# Altium footprint library AUAV_X05.PcbLib: 69 footprints (part 1 of 5)
Each footprint in its own frame and in the unit in brackets; x right, y up, seen from the top. Pads: shape width x height; smd on the part's side, far side on the other; paste and mask are expansions set on the pad; w line width, h text height; cw(c..) or ccw(c..) is an arc to the next point about the centre after c.
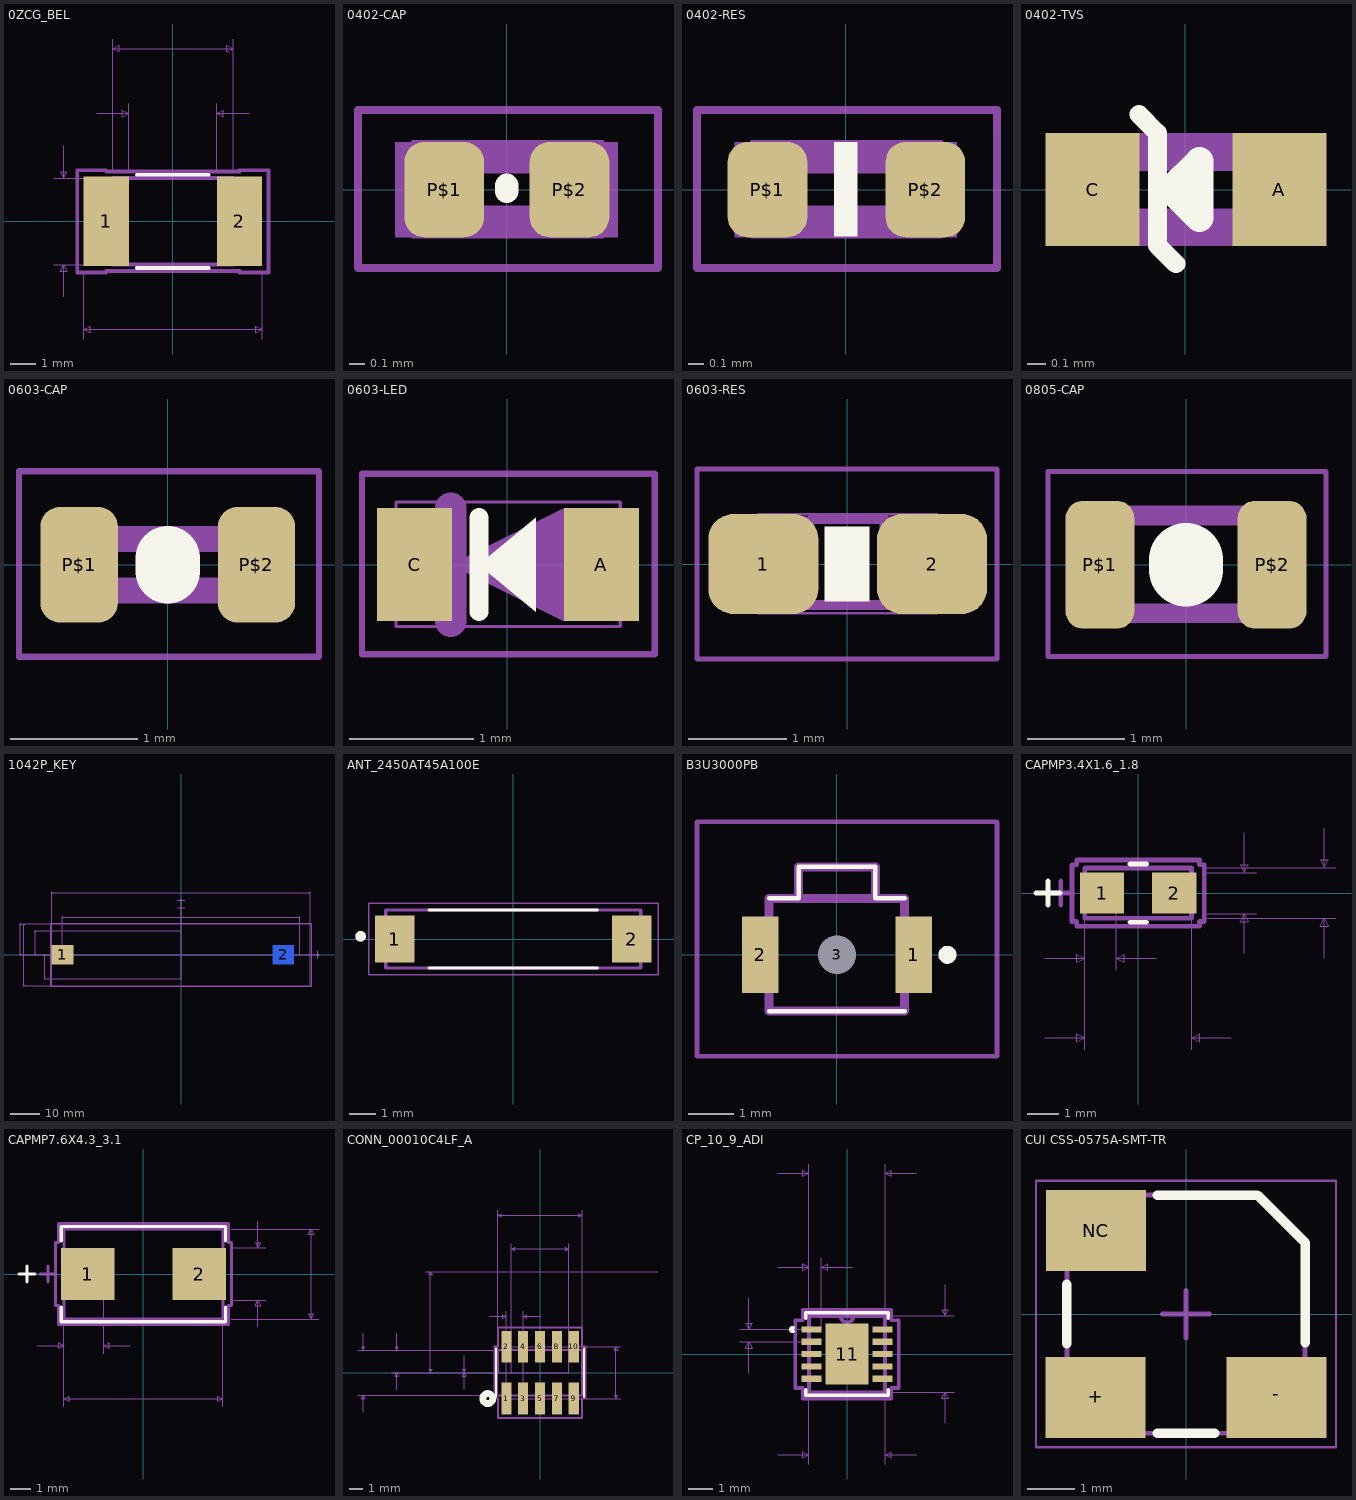
[diagram p0: the footprints below, top view; thin cyan lines are the x and y axes]

## 0ZCG_BEL [mil]
pads (2):
  rect 70x138 smd: 1(-103,0) 2(103,0)
Top Overlay:
  lines w6: -55.25,-72 55.25,-72 ; -55.25,72 55.25,72
Mechanical 1:
  lines w1: -93,-67 -93,67 93,67 93,-67 -93,-67
Mechanical 16:
  lines w1: -184,-67 103,-67 ; -184,67 103,67 ; -169,-117 -169,-67 ; -169,117 -169,67 ; -138,-182 -138,-79 ; -118,167 -68,167 ; -93,79 -93,282 ; -68,79 -68,182 ; 68,79 68,182 ; 93,79 93,282 ; 118,167 68,167 ; 138,-182 138,-79 ; -169,-67 -164,-77 -174,-77 -169,-67 ; -169,67 -164,77 -174,77 -169,67 ; -138,-167 -128,-172 -128,-162 -138,-167 ; -138,-167 138,-167 ; -93,267 -83,262 -83,272 -93,267 ; -93,267 93,267 ; -68,167 -78,162 -78,172 -68,167 ; 68,167 78,162 78,172 68,167 ; 93,267 83,262 83,272 93,267 ; 138,-167 128,-172 128,-162 138,-167
  lines w6: -148,-79 -103,-79 -103,-77 103,-77 103,-79 148,-79 148,79 103,79 103,77 -103,77 -103,79 -148,79 -148,-79 ; -93,-67 -93,67 93,67 93,-67 -93,-67
  text "0.134in/3.404mm" at -189,0 h15.62
  text "0.186in/4.724mm" at 0,287 h15.62
  text "0.136in/3.454mm" at 0,187 h15.62
  text "0.276in/7.01mm" at 0,-187 h15.62
  text "Alternate 2 Pad Style: OX90Y60D30P" at 0,-429 h31.25
  text "Alternate 1 Pad Style: OX60Y90D30P" at 0,-329 h31.25
  text "Default Pad Style: RX70Y138D0T" at 0,-229 h31.25
3D body "0ZCG_BEL.step": height 61.1, standoff -0.12, extent -92,-67.08 93.98,67.09

## 0402-CAP [mil]
pads (2):
  rrect50% 20x24 smd mask+0: P$1(-15.75,0) P$2(15.75,0)
Top Overlay:
  lines w6: 0,-0.39 0,1
Mechanical 16:
  rectangle: 15.96,-12 27.96,12
  rectangle: -28.04,-12 -16.04,12
  lines w1: -23.62,-11.81 -23.62,12 24,12 24,-11.81 -23.62,-11.81
  lines w2: -37.4,-19.68 -37.4,20 38,20 38,-19.68 -37.4,-19.68
  lines w8: -20,-8 20,-8 ; -20,8 20,8
3D body "cap_0402.STEP": height 19.68, standoff 0, extent -19.69,-9.84 19.69,9.84

## 0402-RES [mil] "0402-RES"
height 66.93
pads (2):
  rrect50% 20x24 smd: P$1(-19.68,0) P$2(20,0)
Top Overlay:
  rectangle: -3,-11.8 3,12.01
Mechanical 16:
  rectangle: -28,-12 -16,12
  rectangle: 16,-12 28,12
  lines w1: -23.62,-11.81 24,-11.81 24,12 -23.62,12 -23.62,-11.81
  lines w2: -37.4,-19.68 38,-19.68 38,20 -37.4,20 -37.4,-19.68
  lines w8: -20,-8 20,-8 ; -20,8 20,8
3D body "res_0402.STEP": height 19.68, standoff 0, extent -19.69,-9.84 19.69,9.84

## 0402-TVS [mil] "0402-TVS"
pads (2):
  rect 20x24 smd: A(20,0) C(-19.68,0)
Top Overlay:
  lines w4: -9.84,16 -5.91,12 -5.91,-11.81 -1.97,-15.75
  lines w6: -3,0 3,0 ; -3,0 3,-6 3,0 ; -3,0 3,6 3,0
Mechanical 16:
  rectangle: 16,-12 28,12
  rectangle: -28,-12 -16,12
  lines w8: -20,-8 20,-8 ; -20,8 20,8
3D body "res_0402.STEP": height 19.68, standoff 0, extent -19.69,-9.84 19.68,9.84

## 0603-CAP [mil] "0603-CAP"
pads (2):
  rrect50% 24x36 smd mask+0: P$1(-27.56,0) P$2(27.56,0)
Top Overlay:
  lines w20: 0,-2 0,2
Mechanical 16:
  rectangle: -28,-12 -16,12
  rectangle: 16,-12 28,12
  lines w2: -46.26,-28.54 47,-28.54 47,29 -46.26,29 -46.26,-28.54
  lines w8: -20,-8 20,-8 ; -20,8 20,8
3D body "cap_0603.STEP": height 34.25, standoff -0.39, extent -31.5,-15.95 31.5,15.94

## 0603-LED [mil] "0603-LED"
pads (2):
  rect 24x36 smd: A(30,0) C(-29.53,0)
Top Overlay:
  region: -9,0 9,15 9,-15
  lines w6: -9,-15 -9,15
Mechanical 16:
  region: -18,0 18,18 18,-18
  lines w1: -35.43,-19.68 36,-19.68 36,20 -35.43,20 -35.43,-19.68
  lines w2: -46.26,-28.54 47,-28.54 47,29 -46.26,29 -46.26,-28.54
  lines w10: -18,-18 -18,18
3D body "0603-LED-Blue.STEP": height 35.43, standoff 0, extent -33.46,-17.72 33.47,17.72

## 0603-RES [mil] "0603-RES"
pads (2):
  rrect50% 44x40 smd: 1(-33.46,0) 2(34,0)
Top Overlay:
  rectangle: -9,-15 9,15
Mechanical 6:
  rectangle: -7.87,-11.81 8,12
Mechanical 16:
  rectangle: -33,-18.5 -13.31,19
  rectangle: 13,-18.5 33,19
  lines w1: -35.43,-19.68 36,-19.68 36,20 -35.43,20 -35.43,-19.68
  lines w2: -60,-38 60,-38 60,38 -60,38 -60,-38
  lines w4: -14.02,-16.5 15,-16.5 ; -14.02,18 15,18
3D body "cap_0603.STEP": height 34.25, standoff -0.39, extent -31.5,-15.94 31.5,15.95

## 0805-CAP [mil]
pads (2):
  rrect50% 28x52 smd mask+0: P$1(-35,0) P$2(35,0)
Top Overlay:
  lines w30: 0,-2 0,2
Mechanical 16:
  rectangle: -39.37,-23.67 -23.62,24
  rectangle: 24,-23.67 40,24
  lines w2: -56.1,-37.4 57,-37.4 57,38 -56.1,38 -56.1,-37.4
  lines w8: -23.62,-19.68 24,-19.68 ; -23.62,20 24,20
3D body "cap_0805.STEP": height 30.79, standoff 0, extent -39.37,-24.6 39.37,24.6

## 1042P_KEY [mil]
pads (2):
  rect 294x255 smd: 1(-1562.5,0)
  rect 274.33x255 smd far side: 2(1345.98,0)
Mechanical 1:
  circle w20: c-1562.5,75 r15
  lines w1: -1702,-406.5 1702,-406.5 1702,-203.25 1702,203.25 1702,406.5 -1702,406.5 -1702,-406.5
Mechanical 16:
  lines w1: -2134.5,0 0,0 ; -2134.5,406.5 -1702,406.5 ; -2084.5,-406.5 -1702,-406.5 ; -2084.5,406.5 -1702,406.5 ; -1934.5,0 0,0 ; -1934.5,315 0,315 ; -1809.5,-315 0,-315 ; -1809.5,0 0,0 ; -1702,831.5 -1702,406.5 ; -1562.5,506.5 -1562.5,0 ; -50,616.5 0,616.5 ; -50,716.5 0,716.5 ; 50,616.5 0,616.5 ; 50,716.5 0,716.5 ; 1562.5,0 1562.5,506.5 ; 1702,406.5 1702,831.5 ; 1802,-50 1802,0 ; 1802,50 1802,0 ; -2119.5,0 -2119.5,406.5 ; -2119.5,0 -2124.5,10 -2114.5,10 -2119.5,0 ; -2119.5,406.5 -2124.5,396.5 -2114.5,396.5 -2119.5,406.5 ; -2069.5,-406.5 -2069.5,406.5 ; -2069.5,-406.5 -2074.5,-396.5 -2064.5,-396.5 -2069.5,-406.5 ; -2069.5,406.5 -2074.5,396.5 -2064.5,396.5 -2069.5,406.5 ; -1919.5,0 -1919.5,315 ; -1919.5,0 -1924.5,10 -1914.5,10 -1919.5,0 ; -1919.5,315 -1924.5,305 -1914.5,305 -1919.5,315 ; -1794.5,-315 -1794.5,0 ; -1794.5,-315 -1799.5,-305 -1789.5,-305 -1794.5,-315 ; -1794.5,0 -1799.5,-10 -1789.5,-10 -1794.5,0 ; -1702,816.5 1702,816.5 ; -1702,816.5 -1692,821.5 -1692,811.5 -1702,816.5 ; -1562.5,0 1817,0 -1562.5,0 ; -1562.5,491.5 1562.5,491.5 ; -1562.5,491.5 -1552.5,496.5 -1552.5,486.5 -1562.5,491.5 ; 0,-315 0,731.5 0,-315 ; 0,315 0,631.5 0,315 ; 0,616.5 -10,621.5 -10,611.5 0,616.5 ; 0,616.5 10,621.5 10,611.5 0,616.5 ; 0,716.5 -10,721.5 -10,711.5 0,716.5 ; 0,716.5 10,721.5 10,711.5 0,716.5 ; 1562.5,491.5 1552.5,496.5 1552.5,486.5 1562.5,491.5 ; 1702,816.5 1692,821.5 1692,811.5 1702,816.5 ; 1802,0 1797,10 1807,10 1802,0 ; 1802,0 1797,-10 1807,-10 1802,0
  lines w6: -1719.5,-416.5 -1719.5,416.5 1719.5,416.5 1719.5,-416.5 -1719.5,-416.5
  text "Default Padstyle: RX294Y255D0T" at 0,-516.5 h31.25
  text "1st Mtg Padstyle: EX136Y136D136P" at 0,-591.5 h31.25
  text "2nd Mtg Padstyle: EX136Y136D136P" at 0,-666.5 h31.25
  text "3rd Mtg Padstyle: EX94Y94D94P" at 0,-741.5 h31.25
  text "Left Mtg Padstyle: RX50Y100D30P" at 0,-816.5 h31.25
  text "Right Mtg Padstyle: RX50Y100D30P" at 0,-891.5 h31.25
  text "Alt Padstyle 1: OX60Y90D30P" at 0,-966.5 h31.25
  text "Alt Padstyle 2: OX90Y60D30P" at 0,-1041.5 h31.25
  text "3.125in/79.375mm" at -2343.75,511.5 h15.62
  text "0in/0mm" at 0,636.5 h15.62
  text "0in/0mm" at 0,736.5 h15.62
  text "3.404in/86.462mm" at 0,836.5 h15.62
  text "0in/0mm" at 1822,0 h15.62
  text "-0.315in/-8.001mm" at -1814.5,-157.5 h15.62
  text "0.315in/8.001mm" at -1939.5,157.5 h15.62
  text "0.406in/10.325mm" at -2139.5,203.25 h15.62
  text "0.813in/20.65mm" at -2089.5,0 h15.62
3D body "Battery.step": height 726.93, standoff 0, extent -1700.52,-406.5 1510.35,406.5

## ANT_2450AT45A100E [mm]
pads (2):
  rect 1.5x1.8 smd: 1(-4.5,0) 2(4.5,0)
Top Overlay:
  circle w0.2: c-5.8,0.1 r0.1
  lines w0.127: -3.2,-1.1 3.2,-1.1 ; -3.2,1.1 3.2,1.1
Top 3D Body:
  circle w0.2: c-5.8,0.1 r0.1
  lines w0.127: -4.85,-1.1 4.85,-1.1 4.85,1.1 -4.85,1.1 -4.85,-1.1
Mechanical 15:
  lines w0.05: -5.5,-1.35 -5.5,1.35 5.5,1.35 5.5,-1.35 -5.5,-1.35
3D body "2450AT45A100E--3DModel-STEP-56544.STEP": height 1.3, standoff 0, extent -4.75,-1 4.75,1

## B3U3000PB [mm]
pads (3):
  rect 0.8x1.7 smd: 1(1.7,0) 2(-1.7,0)
  round 0.425 hole 0.85 unplated: 3(0,0)
Top Overlay:
  lines w0.1: -1.5,-1.25 1.5,-1.25 ; -1.5,1.25 -0.85,1.25 -0.85,1.95 0.85,1.95 0.85,1.25 1.5,1.25
  lines w0.2: 2.345,0 ccw(c2.445,0) 2.545,0 ccw(c2.445,0) 2.345,0
Top 3D Body:
  lines w0.2: -0.85,1.25 -0.85,1.95 0.85,1.95 0.85,1.25 ; -1.5,-1.25 1.5,-1.25 1.5,1.25 -1.5,1.25 -1.5,-1.25
Mechanical 15:
  lines w0.1: -3.1,-2.25 3.545,-2.25 3.545,2.95 -3.1,2.95 -3.1,-2.25
3D body "B3U-3000P--3DModel-STEP-56544.STEP": height 1.2, standoff 0, extent -2,-1.25 2,1.95

## CAPMP3.4X1.6_1.8 [mm]
pads (2):
  rect 1.405x1.3 smd: 1(-1.15,0) 2(1.15,0)
Top Overlay:
  lines w0.152: -3.251,0 -2.489,0 ; -2.87,-0.381 -2.87,0.381 ; -0.263,-0.927 0.263,-0.927 ; -0.263,0.927 0.263,0.927
Mechanical 1:
  lines w0.025: -3.251,0 -2.489,0 ; -2.87,-0.381 -2.87,0.381 ; -1.7,-0.8 1.7,-0.8 1.7,0.8 -1.7,0.8 -1.7,-0.8
Mechanical 16:
  lines w0.025: -2.97,-4.61 -1.7,-4.61 ; -2.97,-2.07 -1.7,-2.07 ; -1.7,-4.991 -1.7,0 -1.7,-2.451 ; -0.7,-2.451 -0.7,0 ; 0.57,-2.07 -0.7,-2.07 ; 1.7,-4.991 1.7,0 ; 2.106,-0.8 6.297,-0.8 ; 2.106,-0.65 3.757,-0.65 ; 2.106,0.65 3.757,0.65 ; 2.106,0.8 6.297,0.8 ; 2.97,-4.61 1.7,-4.61 ; 3.376,-1.92 3.376,-0.65 ; 3.376,1.92 3.376,0.65 ; 5.916,-2.07 5.916,-0.8 ; 5.916,2.07 5.916,0.8 ; -1.7,-4.61 -1.954,-4.483 -1.954,-4.737 -1.7,-4.61 ; -1.7,-2.07 -1.954,-1.943 -1.954,-2.197 -1.7,-2.07 ; -0.7,-2.07 -0.446,-1.943 -0.446,-2.197 -0.7,-2.07 ; 1.7,-4.61 1.954,-4.483 1.954,-4.737 1.7,-4.61 ; 3.376,-0.65 3.249,-0.904 3.503,-0.904 3.376,-0.65 ; 3.376,0.65 3.249,0.904 3.503,0.904 3.376,0.65 ; 5.916,-0.8 5.789,-1.054 6.043,-1.054 5.916,-0.8 ; 5.916,0.8 5.789,1.054 6.043,1.054 5.916,0.8
  lines w0.152: -2.843,0 -2.081,0 ; -2.462,-0.381 -2.462,0.381 ; -2.106,-0.904 -2.106,0.904 -1.954,0.904 -1.954,1.054 1.954,1.054 1.954,0.904 2.106,0.904 2.106,-0.904 1.954,-0.904 1.954,-1.054 -1.954,-1.054 -1.954,-0.904 -2.106,-0.904 ; -1.7,-0.8 -1.7,0.8 1.7,0.8 1.7,-0.8 -1.7,-0.8
  text "Default Padstyle: RX55p33Y51p18D0T" at 0,-6.515 h0.79
  text "Alt 1 Padstyle: OX60Y90D30P" at 0,-8.42 h0.79
  text "Alt 2 Padstyle: OX90Y60D30P" at 0,-10.325 h0.79
  text "0.051in/1.3mm" at 3.884,0 h0.4
  text "0.063in/1.6mm" at 6.424,0 h0.4
  text "0.134in/3.4mm" at 0,-5.118 h0.4
  text "0.039in/1mm" at -1.2,-2.578 h0.4
3D body "CTSM_TCM2NK_3216_L3.4W1.8H1.8T0.13S0.8F1.3A1.2B0.55E1.3G1.1P0.4R0.4X0.2.step": height 1.81, standoff 0, extent -1.7,-0.9 1.7,0.9

## CAPMP7.6X4.3_3.1 [mm]
pads (2):
  rect 2.56x2.5 smd: 1(-2.672,0) 2(2.672,0)
Top Overlay:
  lines w0.152: -5.951,0 -5.189,0 ; -5.57,-0.381 -5.57,0.381 ; -3.927,-1.583 -3.927,-2.277 3.927,-2.277 3.927,-1.583 ; -3.927,1.583 -3.927,2.277 3.927,2.277 3.927,1.583
Mechanical 1:
  lines w0.025: -5.951,0 -5.189,0 ; -5.57,-0.381 -5.57,0.381 ; -3.8,-2.159 3.8,-2.159 3.8,2.15 -3.8,2.15 -3.8,-2.159
Mechanical 16:
  lines w0.025: -5.07,-3.42 -3.8,-3.42 ; -3.8,-6.341 -3.8,0 -3.8,-3.801 ; -1.9,-3.801 -1.9,0 ; -0.63,-3.42 -1.9,-3.42 ; 3.8,-6.341 3.8,0 ; 4.206,-2.15 8.397,-2.15 ; 4.206,-1.25 5.857,-1.25 ; 4.206,1.25 5.857,1.25 ; 4.206,2.15 8.397,2.15 ; 5.476,-2.52 5.476,-1.25 ; 5.476,2.52 5.476,1.25 ; -3.8,-5.96 3.8,-5.96 ; -3.8,-5.96 -3.546,-5.833 -3.546,-6.087 -3.8,-5.96 ; -3.8,-3.42 -4.054,-3.293 -4.054,-3.547 -3.8,-3.42 ; -1.9,-3.42 -1.646,-3.293 -1.646,-3.547 -1.9,-3.42 ; 3.8,-5.96 3.546,-5.833 3.546,-6.087 3.8,-5.96 ; 5.476,-1.25 5.349,-1.504 5.603,-1.504 5.476,-1.25 ; 5.476,1.25 5.349,1.504 5.603,1.504 5.476,1.25 ; 8.016,-2.15 8.016,2.15 ; 8.016,-2.15 7.889,-1.896 8.143,-1.896 8.016,-2.15 ; 8.016,2.15 7.889,1.896 8.143,1.896 8.016,2.15
  lines w0.152: -4.943,0 -4.181,0 ; -4.562,-0.381 -4.562,0.381 ; -4.206,-1.504 -4.206,1.504 -4.054,1.504 -4.054,2.404 4.054,2.404 4.054,1.504 4.206,1.504 4.206,-1.504 4.054,-1.504 4.054,-2.404 -4.054,-2.404 -4.054,-1.504 -4.206,-1.504 ; -3.8,-2.15 -3.8,2.15 3.8,2.15 3.8,-2.15 -3.8,-2.15
  text "Default Padstyle: RX100p8Y98p42D0T" at 0,-7.865 h0.79
  text "Alt 1 Padstyle: OX60Y90D30P" at 0,-9.77 h0.79
  text "Alt 2 Padstyle: OX90Y60D30P" at 0,-11.675 h0.79
  text "0.098in/2.5mm" at 5.984,0 h0.4
  text "0.169in/4.3mm" at 8.524,0 h0.4
  text "0.299in/7.6mm" at 0,-6.468 h0.4
  text "0.063in/1.6mm" at -2.85,-3.928 h0.4
3D body "CTSM_TCM2NK_7343_L7.6W4.6H3.1T0.13S1.3F2.5A3.6B0.65E3.5G3.5P0.9R1X0.2.step": height 3.11, standoff 0, extent -3.79,-2.3 3.81,2.3

## CONN_00010C4LF_A [mil]
pads (10):
  rect 30x94 smd: 1(-100,-76.77) 2(-100,76.77) 3(-50,-76.77) 4(-50,76.77) 5(0,-76.77) 6(0,76.77) 7(50,-76.77) 8(50,76.77) 9(100,-76.77) 10(100,76.77)
Top Overlay:
  circle w20: c-155,-76.77 r15
  lines w6: -130,-72 -130,72 ; 130,-72 130,72
Mechanical 1:
  lines w1: -125,-67 -125,67 125,67 125,-67 -125,-67
Mechanical 16:
  lines w1: -540,-67 -125,-67 ; -540,67 -125,67 ; -525,-117 -525,-67 ; -525,117 -525,67 ; -440,0 0,0 ; -440,67 -125,67 ; -425,-50 -425,0 ; -425,117 -425,67 ; -340,0 0,0 ; -340,300 350,300 ; -225,-50 -225,0 ; -225,50 -225,0 ; -150,167 -100,167 ; -125,482 -125,67 ; -100,76.77 240,76.77 ; -100,182 -100,-76.77 240,-76.77 ; -85.63,0 -85.63,382 ; -50,-76.77 -50,182 ; 0,167 -50,167 ; 85.63,382 85.63,0 -240,0 0,0 ; 125,67 125,482 ; -525,-67 -520,-77 -530,-77 -525,-67 ; -525,67 -520,77 -530,77 -525,67 ; -425,0 -420,-10 -430,-10 -425,0 ; -425,67 -420,77 -430,77 -425,67 ; -325,0 -320,10 -330,10 -325,0 ; -325,0 -325,300 ; -325,300 -320,290 -330,290 -325,300 ; -225,0 -220,-10 -230,-10 -225,0 ; -225,0 -220,10 -230,10 -225,0 ; -125,467 -115,462 -115,472 -125,467 ; -125,467 125,467 ; -100,167 -110,162 -110,172 -100,167 ; -85.63,367 -75.63,362 -75.63,372 -85.63,367 ; -85.63,367 85.63,367 ; -50,167 -40,162 -40,172 -50,167 ; 85.63,367 75.63,362 75.63,372 85.63,367 ; 125,467 115,462 115,472 125,467 ; 225,-76.77 230,-66.77 220,-66.77 225,-76.77 ; 225,-76.77 225,76.77 ; 225,76.77 230,66.77 220,66.77 225,76.77
  lines w6: -125,-67 125,-67 125,67 -125,67 -125,0 ; -135,-77 -125,-77 -125,-133.77 125,-133.77 125,-77 135,-77 135,77 125,77 125,133.77 -125,133.77 -125,77 -135,77 -135,-77
  text "0.134in/3.404mm" at -545,33.5 h15.62
  text "0.067in/1.702mm" at -445,33.5 h15.62
  text "0.3in/7.62mm" at -345,150 h15.62
  text "0in/0mm" at -245,0 h15.62
  text "0.154in/3.9mm" at 245,0 h15.62
  text "0.25in/6.35mm" at 0,487 h15.62
  text "0.171in/4.35mm" at 0,387 h15.62
  text "0.05in/1.27mm" at -75,187 h15.62
  text "Alt Padstyle 2: OX90Y60D30P" at 0,-692 h31.25
  text "Alt Padstyle 1: OX60Y90D30P" at 0,-617 h31.25
  text "Right Mtg Padstyle: EX60Y60D30P" at 0,-542 h31.25
  text "Left Mtg Padstyle: EX60Y60D30P" at 0,-467 h31.25
  text "3rd Mtg Padstyle: EX70Y70D70P" at 0,-392 h31.25
  text "2nd Mtg Padstyle: EX70Y70D70P" at 0,-317 h31.25
  text "1st Mtg Padstyle: EX52Y52D32P" at 0,-242 h31.25
  text "Default Padstyle: RX30Y94D0T" at 0,-167 h31.25
3D body "20021121-00010XXLFc.stp": height 177.42, standoff 0.25, extent -124.99,-108.27 125,108.27

## CP_10_9_ADI [mil]
pads (11):
  rect 32x10 smd: 1(-57,39.37) 2(-57,19.68) 3(-57,0) 4(-57,-19.68) 5(-57,-39.37) 6(57,-39.37) 7(57,-19.68) 8(57,0) 9(57,19.68) 10(57,39.37)
  rect 69x98 smd: 11(0,0)
Top Overlay:
  lines w6: -86.1,36.46 cw(c-86.84,39.37) -86.1,42.28 ; -66,-57.47 -66,-66 66,-66 66,-57.47 ; -66,57.47 -66,66 66,66 66,57.47
Mechanical 1:
  lines w1: -12,61 ccw(c0,61) 12,61 ; -61,-61 -61,61 61,61 61,-61 -61,-61
Mechanical 16:
  lines w1: -172,19.68 -57,19.68 ; -172,39.37 -57,39.37 ; -157,-30.32 -157,19.68 ; -157,89.37 -157,39.37 ; -111,-161 -61,-161 ; -111,139.37 -61,139.37 ; -111,289.37 -61,289.37 ; -61,-176 -61,-61 ; -61,154.37 -61,39.37 -61,304.37 ; -41,39.37 -41,154.37 ; 9,139.37 -41,139.37 ; 61,-176 61,-61 172,-61 ; 61,39.37 61,304.37 ; 61,61 172,61 ; 111,-161 61,-161 ; 111,289.37 61,289.37 ; 157,-111 157,-61 ; 157,111 157,61 ; -157,19.68 -152,9.69 -162,9.69 -157,19.68 ; -157,39.37 -152,49.37 -162,49.37 -157,39.37 ; -61,-161 -71,-166 -71,-156 -61,-161 ; -61,139.37 -71,134.37 -71,144.37 -61,139.37 ; -61,289.37 -71,284.37 -71,294.37 -61,289.37 ; -41,139.37 -31,134.37 -31,144.37 -41,139.37 ; 61,-161 71,-166 71,-156 61,-161 ; 61,289.37 71,284.37 71,294.37 61,289.37 ; 157,-61 162,-71 152,-71 157,-61 ; 157,61 162,71 152,71 157,61
  lines w6: -10.17,61 ccw(c0,61) 10.17,61 ; -83,-54.37 -71,-54.37 -71,-71 71,-71 71,-54.37 83,-54.37 83,54.37 71,54.37 71,71 -71,71 -71,54.37 -83,54.37 -83,-54.37 ; -61,-61 61,-61 61,61 -61,61 -61,-61
  text "0.122in/3.099mm" at 0,-181 h15.62
  text "0.122in/3.099mm" at 177,0 h15.62
  text "0.02in/0.5mm" at -177,29.53 h15.62
  text "0.02in/0.508mm" at -51,159.37 h15.62
  text "0.122in/3.099mm" at 0,309.37 h15.62
  text "Alt 2 Padstyle: OX90Y60D30P" at 0,-621 h31.25
  text "Alt 1 Padstyle: OX60Y90D30P" at 0,-561 h31.25
  text "Heat Tab Padstyle: RX69Y98D0T" at 0,-441 h31.25
  text "Default Padstyle: RX32Y10D0T" at 0,-381 h31.25
3D body "CP_10_9_ADI.step": height 31.1, standoff 0, extent -60.98,-60.98 60.99,60.99

## CUI CSS-0575A-SMT-TR [mm]
pads (3):
  rect 2.1x1.7 smd: +(-1.9,-1.75) -(1.9,-1.75) NC(-1.892,1.754)
Top Overlay:
  lines w0.2: -2.5,-0.625 -2.5,0.625 ; -0.6,-2.5 0.6,-2.5 ; -0.6,2.5 1.5,2.5 2.5,1.5 2.5,-0.6
Top 3D Body:
  lines w0.1: -2.5,-2.5 -2.5,2.5 1.5,2.5 2.5,1.5 2.5,-2.5 -2.5,-2.5
Mechanical 15:
  lines w0.05: -3.15,-2.8 -3.15,2.8 3.15,2.8 3.15,-2.8 -3.15,-2.8
  lines w0.1: -0.5,0 0.5,0 ; 0,-0.5 0,0.5
3D body "CUI - CSS-0575A-SMT.step": height 2, standoff 0, extent -2.5,-2.5 2.5,2.5